# Altium footprint library Molex FFC - FPC Connectors (SMT).PcbLib: 638 footprints (part 35 of 40)
Each footprint in its own frame and in the unit in brackets; x right, y up, seen from the top. Pads: shape width x height; smd on the part's side, far side on the other; paste and mask are expansions set on the pad; w line width, h text height; cw(c..) or ccw(c..) is an arc to the next point about the centre after c.
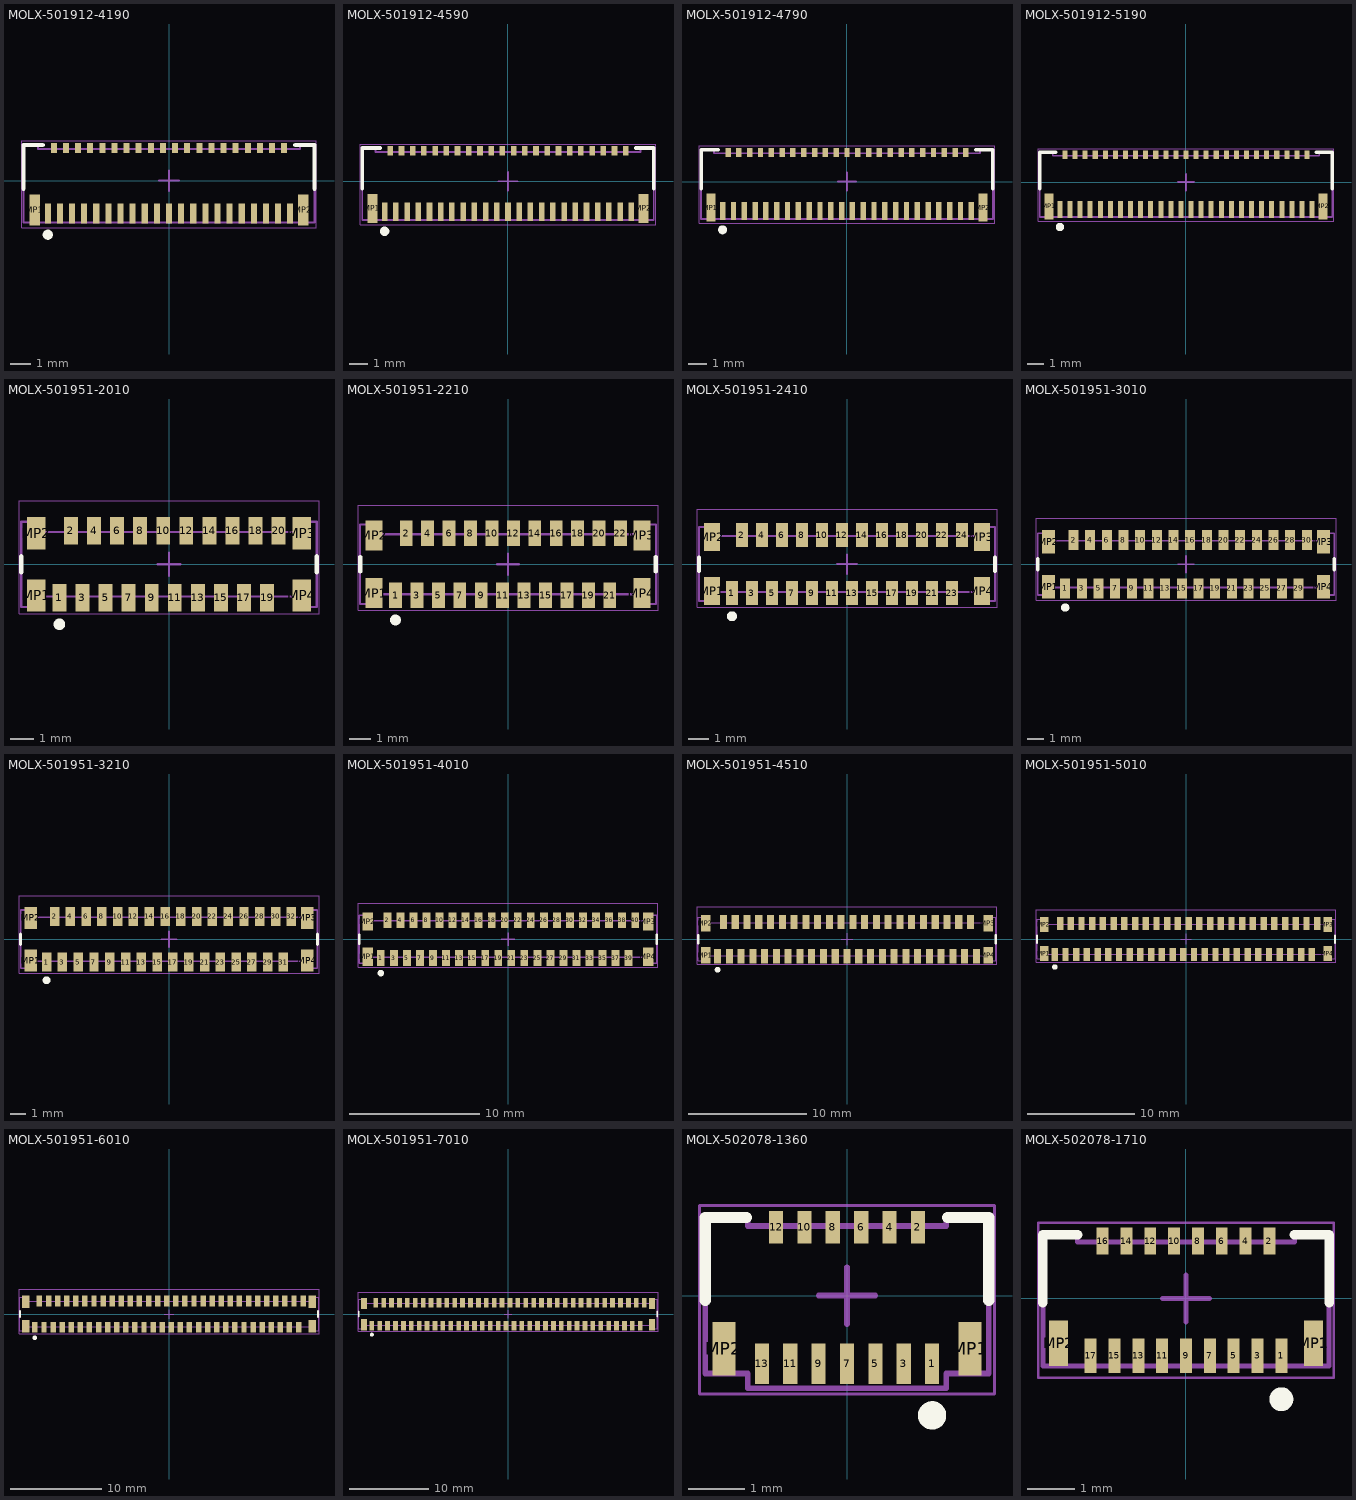
[diagram p34: the footprints below, top view; thin cyan lines are the x and y axes]

## MOLX-501912-4190 [mm] "FPC Connector, 41-Leads, Right Angle, Pitch 0.3 mm, Mated Height 1.8 mm, SMT"
height 1.812
pads (43):
  rect 0.3x1 smd: 1(-6,-1.625) 3(-5.4,-1.625) 5(-4.8,-1.625) 7(-4.2,-1.625) 9(-3.6,-1.625) 11(-3,-1.625) 13(-2.4,-1.625) 15(-1.8,-1.625) 17(-1.2,-1.625) 19(-0.6,-1.625) 21(0,-1.625) 23(0.6,-1.625) 25(1.2,-1.625) 27(1.8,-1.625) 29(2.4,-1.625) 31(3,-1.625) 33(3.6,-1.625) 35(4.2,-1.625) 37(4.8,-1.625) 39(5.4,-1.625) 41(6,-1.625)
  rect 0.3x0.5 smd: 2(-5.7,1.625) 4(-5.1,1.625) 6(-4.5,1.625) 8(-3.9,1.625) 10(-3.3,1.625) 12(-2.7,1.625) 14(-2.1,1.625) 16(-1.5,1.625) 18(-0.9,1.625) 20(-0.3,1.625) 22(0.3,1.625) 24(0.9,1.625) 26(1.5,1.625) 28(2.1,1.625) 30(2.7,1.625) 32(3.3,1.625) 34(3.9,1.625) 36(4.5,1.625) 38(5.1,1.625) 40(5.7,1.625)
  rect 0.52x1.55 smd: MP1(-6.65,-1.45) MP2(6.65,-1.45)
Top Overlay:
  circle w0.25: c-6,-2.675 r0.125
  lines w0.2: -7.2,-0.399 -7.2,1.775 -6.25,1.775 ; 6.25,1.775 7.2,1.775 7.2,-0.399
Mechanical 13:
  lines w0.1: -7.2,-2.075 7.2,-2.075 7.2,1.775 6.48,1.775 6.48,1.575 -6.48,1.575 -6.48,1.775 -7.2,1.775 -7.2,-2.075
Mechanical 15:
  lines w0.05: -7.3,-2.325 7.3,-2.325 7.3,1.975 -7.3,1.975 -7.3,-2.325
  lines w0.1: -0.5,0 0.5,0 ; 0,-0.5 0,0.5
3D body: height 0.25, standoff 0, extent -7.2,-2.075 7.2,1.775

## MOLX-501912-4590 [mm] "FPC Connector, 45-Leads, Right Angle, Pitch 0.3 mm, Mated Height 1.8 mm, SMT"
height 1.812
pads (47):
  rect 0.3x1 smd: 1(-6.6,-1.625) 3(-6,-1.625) 5(-5.4,-1.625) 7(-4.8,-1.625) 9(-4.2,-1.625) 11(-3.6,-1.625) 13(-3,-1.625) 15(-2.4,-1.625) 17(-1.8,-1.625) 19(-1.2,-1.625) 21(-0.6,-1.625) 23(0,-1.625) 25(0.6,-1.625) 27(1.2,-1.625) 29(1.8,-1.625) 31(2.4,-1.625) 33(3,-1.625) 35(3.6,-1.625) 37(4.2,-1.625) 39(4.8,-1.625) 41(5.4,-1.625) 43(6,-1.625) 45(6.6,-1.625)
  rect 0.3x0.5 smd: 2(-6.3,1.625) 4(-5.7,1.625) 6(-5.1,1.625) 8(-4.5,1.625) 10(-3.9,1.625) 12(-3.3,1.625) 14(-2.7,1.625) 16(-2.1,1.625) 18(-1.5,1.625) 20(-0.9,1.625) 22(-0.3,1.625) 24(0.3,1.625) 26(0.9,1.625) 28(1.5,1.625) 30(2.1,1.625) 32(2.7,1.625) 34(3.3,1.625) 36(3.9,1.625) 38(4.5,1.625) 40(5.1,1.625) 42(5.7,1.625) 44(6.3,1.625)
  rect 0.52x1.55 smd: MP1(-7.25,-1.45) MP2(7.25,-1.45)
Top Overlay:
  circle w0.25: c-6.6,-2.675 r0.125
  lines w0.2: -7.8,-0.399 -7.8,1.775 -6.85,1.775 ; 6.85,1.775 7.8,1.775 7.8,-0.399
Mechanical 13:
  lines w0.1: -7.8,-2.075 7.8,-2.075 7.8,1.775 7.08,1.775 7.08,1.575 -7.08,1.575 -7.08,1.775 -7.8,1.775 -7.8,-2.075
Mechanical 15:
  lines w0.05: -7.9,-2.325 -7.9,1.975 7.9,1.975 7.9,-2.325 -7.9,-2.325
  lines w0.1: -0.5,0 0.5,0 ; 0,-0.5 0,0.5
3D body: height 0.25, standoff 0, extent -7.8,-2.075 7.8,1.775

## MOLX-501912-4790 [mm] "FPC Connector, 47-Leads, Right Angle, Pitch 0.3 mm, Mated Height 1.8 mm, SMT"
height 1.812
pads (49):
  rect 0.3x1 smd: 1(-6.9,-1.625) 3(-6.3,-1.625) 5(-5.7,-1.625) 7(-5.1,-1.625) 9(-4.5,-1.625) 11(-3.9,-1.625) 13(-3.3,-1.625) 15(-2.7,-1.625) 17(-2.1,-1.625) 19(-1.5,-1.625) 21(-0.9,-1.625) 23(-0.3,-1.625) 25(0.3,-1.625) 27(0.9,-1.625) 29(1.5,-1.625) 31(2.1,-1.625) 33(2.7,-1.625) 35(3.3,-1.625) 37(3.9,-1.625) 39(4.5,-1.625) 41(5.1,-1.625) 43(5.7,-1.625) 45(6.3,-1.625) 47(6.9,-1.625)
  rect 0.3x0.5 smd: 2(-6.6,1.625) 4(-6,1.625) 6(-5.4,1.625) 8(-4.8,1.625) 10(-4.2,1.625) 12(-3.6,1.625) 14(-3,1.625) 16(-2.4,1.625) 18(-1.8,1.625) 20(-1.2,1.625) 22(-0.6,1.625) 24(0,1.625) 26(0.6,1.625) 28(1.2,1.625) 30(1.8,1.625) 32(2.4,1.625) 34(3,1.625) 36(3.6,1.625) 38(4.2,1.625) 40(4.8,1.625) 42(5.4,1.625) 44(6,1.625) 46(6.6,1.625)
  rect 0.52x1.55 smd: MP1(-7.55,-1.45) MP2(7.55,-1.45)
Top Overlay:
  circle w0.25: c-6.9,-2.675 r0.125
  lines w0.2: -8.1,-0.399 -8.1,1.775 -7.15,1.775 ; 7.15,1.775 8.1,1.775 8.1,-0.399
Mechanical 13:
  lines w0.1: -8.1,-2.075 -8.1,1.775 -7.38,1.775 -7.38,1.575 7.38,1.575 7.38,1.775 8.1,1.775 8.1,-2.075 -8.1,-2.075
Mechanical 15:
  lines w0.05: -8.2,-2.325 8.2,-2.325 8.2,1.975 -8.2,1.975 -8.2,-2.325
  lines w0.1: -0.5,0 0.5,0 ; 0,-0.5 0,0.5
3D body: height 0.25, standoff 0, extent -8.1,-2.075 8.1,1.775

## MOLX-501912-5190 [mm] "FPC Connector, 51-Leads, Right Angle, Pitch 0.3 mm, Mated Height 1.8 mm, SMT"
height 1.812
pads (53):
  rect 0.3x1 smd: 1(-7.5,-1.625) 3(-6.9,-1.625) 5(-6.3,-1.625) 7(-5.7,-1.625) 9(-5.1,-1.625) 11(-4.5,-1.625) 13(-3.9,-1.625) 15(-3.3,-1.625) 17(-2.7,-1.625) 19(-2.1,-1.625) 21(-1.5,-1.625) 23(-0.9,-1.625) 25(-0.3,-1.625) 27(0.3,-1.625) 29(0.9,-1.625) 31(1.5,-1.625) 33(2.1,-1.625) 35(2.7,-1.625) 37(3.3,-1.625) 39(3.9,-1.625) 41(4.5,-1.625) 43(5.1,-1.625) 45(5.7,-1.625) 47(6.3,-1.625) 49(6.9,-1.625) 51(7.5,-1.625)
  rect 0.3x0.5 smd: 2(-7.2,1.625) 4(-6.6,1.625) 6(-6,1.625) 8(-5.4,1.625) 10(-4.8,1.625) 12(-4.2,1.625) 14(-3.6,1.625) 16(-3,1.625) 18(-2.4,1.625) 20(-1.8,1.625) 22(-1.2,1.625) 24(-0.6,1.625) 26(0,1.625) 28(0.6,1.625) 30(1.2,1.625) 32(1.8,1.625) 34(2.4,1.625) 36(3,1.625) 38(3.6,1.625) 40(4.2,1.625) 42(4.8,1.625) 44(5.4,1.625) 46(6,1.625) 48(6.6,1.625) 50(7.2,1.625)
  rect 0.52x1.55 smd: MP1(-8.15,-1.45) MP2(8.15,-1.45)
Top Overlay:
  circle w0.25: c-7.5,-2.675 r0.125
  lines w0.2: -8.7,-0.4 -8.7,1.775 -7.75,1.775 ; 7.75,1.775 8.7,1.775 8.7,-0.4
Mechanical 13:
  lines w0.1: -8.7,-2.075 -8.7,1.775 -7.92,1.775 -7.92,1.575 7.92,1.575 7.92,1.775 8.7,1.775 8.7,-2.075 -8.7,-2.075
Mechanical 15:
  lines w0.05: -8.8,-2.325 8.8,-2.325 8.8,1.975 -8.8,1.975 -8.8,-2.325
  lines w0.1: -0.5,0 0.5,0 ; 0,-0.5 0,0.5
3D body: height 0.25, standoff 0, extent -8.7,-2.075 8.7,1.775

## MOLX-501951-2010 [mm] "FPC Connector, 20-Leads, Vertical, Pitch 0.5 mm, Mated Height 4.05 mm, SMT"
height 4.05
pads (24):
  rect 0.6x1.2 smd: 1(-4.75,-1.45) 2(-4.25,1.45) 3(-3.75,-1.45) 4(-3.25,1.45) 5(-2.75,-1.45) 6(-2.25,1.45) 7(-1.75,-1.45) 8(-1.25,1.45) 9(-0.75,-1.45) 10(-0.25,1.45) 11(0.25,-1.45) 12(0.75,1.45) 13(1.25,-1.45) 14(1.75,1.45) 15(2.25,-1.45) 16(2.75,1.45) 17(3.25,-1.45) 18(3.75,1.45) 19(4.25,-1.45) 20(4.75,1.45)
  rect 0.8x1.4 smd: MP1(-5.75,-1.35) MP2(-5.75,1.35) MP3(5.75,1.35) MP4(5.75,-1.35)
Top Overlay:
  circle w0.25: c-4.75,-2.6 r0.125
  lines w0.2: -6.4,-0.338 -6.4,0.338 ; 6.4,-0.338 6.4,0.338
Mechanical 13:
  lines w0.1: -6.4,-1.85 -5.85,-1.85 -5.85,-1.75 -5.5,-1.75 -5.5,-1.4 5.5,-1.4 5.5,-1.75 5.85,-1.75 5.85,-1.85 6.4,-1.85 6.4,1.85 5.85,1.85 5.85,1.75 5.5,1.75 5.5,1.4 -5.5,1.4 -5.5,1.75 -5.85,1.75 -5.85,1.85 -6.4,1.85 -6.4,-1.85
Mechanical 15:
  lines w0.05: -6.5,-2.15 6.5,-2.15 6.5,2.75 -6.5,2.75 -6.5,-2.15
  lines w0.1: -0.5,0 0.5,0 ; 0,-0.5 0,0.5
3D body: height 0.25, standoff 0, extent -6.4,-1.85 6.4,2.65

## MOLX-501951-2210 [mm] "FPC Connector, 22-Leads, Vertical, Pitch 0.5 mm, Mated Height 4.05 mm, SMT"
height 4.05
pads (26):
  rect 0.6x1.2 smd: 1(-5.25,-1.45) 2(-4.75,1.45) 3(-4.25,-1.45) 4(-3.75,1.45) 5(-3.25,-1.45) 6(-2.75,1.45) 7(-2.25,-1.45) 8(-1.75,1.45) 9(-1.25,-1.45) 10(-0.75,1.45) 11(-0.25,-1.45) 12(0.25,1.45) 13(0.75,-1.45) 14(1.25,1.45) 15(1.75,-1.45) 16(2.25,1.45) 17(2.75,-1.45) 18(3.25,1.45) 19(3.75,-1.45) 20(4.25,1.45) 21(4.75,-1.45) 22(5.25,1.45)
  rect 0.8x1.4 smd: MP1(-6.25,-1.35) MP2(-6.25,1.35) MP3(6.25,1.35) MP4(6.25,-1.35)
Top Overlay:
  circle w0.25: c-5.25,-2.6 r0.125
  lines w0.2: -6.9,-0.338 -6.9,0.338 ; 6.9,-0.338 6.9,0.338
Mechanical 13:
  lines w0.1: -6.9,-1.85 -6.35,-1.85 -6.35,-1.75 -6,-1.75 -6,-1.4 6,-1.4 6,-1.75 6.35,-1.75 6.35,-1.85 6.9,-1.85 6.9,1.85 6.35,1.85 6.35,1.75 6,1.75 6,1.4 -6,1.4 -6,1.75 -6.35,1.75 -6.35,1.85 -6.9,1.85 -6.9,-1.85
Mechanical 15:
  lines w0.05: -7,-2.15 7,-2.15 7,2.75 -7,2.75 -7,-2.15
  lines w0.1: -0.5,0 0.5,0 ; 0,-0.5 0,0.5
3D body: height 0.25, standoff 0, extent -6.9,-1.85 6.9,2.65

## MOLX-501951-2410 [mm] "FPC Connector, 24-Leads, Vertical, Pitch 0.5 mm, Mated Height 4.05 mm, SMT"
height 4.05
pads (28):
  rect 0.6x1.2 smd: 1(-5.75,-1.45) 2(-5.25,1.45) 3(-4.75,-1.45) 4(-4.25,1.45) 5(-3.75,-1.45) 6(-3.25,1.45) 7(-2.75,-1.45) 8(-2.25,1.45) 9(-1.75,-1.45) 10(-1.25,1.45) 11(-0.75,-1.45) 12(-0.25,1.45) 13(0.25,-1.45) 14(0.75,1.45) 15(1.25,-1.45) 16(1.75,1.45) 17(2.25,-1.45) 18(2.75,1.45) 19(3.25,-1.45) 20(3.75,1.45) 21(4.25,-1.45) 22(4.75,1.45) 23(5.25,-1.45) 24(5.75,1.45)
  rect 0.8x1.4 smd: MP1(-6.75,-1.35) MP2(-6.75,1.35) MP3(6.75,1.35) MP4(6.75,-1.35)
Top Overlay:
  circle w0.25: c-5.75,-2.6 r0.125
  lines w0.2: -7.4,-0.338 -7.4,0.338 ; 7.4,-0.338 7.4,0.338
Mechanical 13:
  lines w0.1: -7.4,-1.85 -6.85,-1.85 -6.85,-1.75 -6.5,-1.75 -6.5,-1.4 6.5,-1.4 6.5,-1.75 6.85,-1.75 6.85,-1.85 7.4,-1.85 7.4,1.85 6.85,1.85 6.85,1.75 6.5,1.75 6.5,1.4 -6.5,1.4 -6.5,1.75 -6.85,1.75 -6.85,1.85 -7.4,1.85 -7.4,-1.85
Mechanical 15:
  lines w0.05: -7.5,-2.15 7.5,-2.15 7.5,2.75 -7.5,2.75 -7.5,-2.15
  lines w0.1: -0.5,0 0.5,0 ; 0,-0.5 0,0.5
3D body: height 0.25, standoff 0, extent -7.4,-1.85 7.4,2.65

## MOLX-501951-3010 [mm] "FPC Connector, 30-Leads, Vertical, Pitch 0.5 mm, Mated Height 4.05 mm, SMT"
height 4.05
pads (34):
  rect 0.6x1.2 smd: 1(-7.25,-1.45) 2(-6.75,1.45) 3(-6.25,-1.45) 4(-5.75,1.45) 5(-5.25,-1.45) 6(-4.75,1.45) 7(-4.25,-1.45) 8(-3.75,1.45) 9(-3.25,-1.45) 10(-2.75,1.45) 11(-2.25,-1.45) 12(-1.75,1.45) 13(-1.25,-1.45) 14(-0.75,1.45) 15(-0.25,-1.45) 16(0.25,1.45) 17(0.75,-1.45) 18(1.25,1.45) 19(1.75,-1.45) 20(2.25,1.45) 21(2.75,-1.45) 22(3.25,1.45) 23(3.75,-1.45) 24(4.25,1.45) 25(4.75,-1.45) 26(5.25,1.45) 27(5.75,-1.45) 28(6.25,1.45) 29(6.75,-1.45) 30(7.25,1.45)
  rect 0.8x1.4 smd: MP1(-8.25,-1.35) MP2(-8.25,1.35) MP3(8.25,1.35) MP4(8.25,-1.35)
Top Overlay:
  circle w0.25: c-7.25,-2.6 r0.125
  lines w0.2: -8.9,-0.338 -8.9,0.338 ; 8.9,-0.338 8.9,0.338
Mechanical 13:
  lines w0.1: -8.9,-1.85 -8.35,-1.85 -8.35,-1.75 -8,-1.75 -8,-1.4 8,-1.4 8,-1.75 8.35,-1.75 8.35,-1.85 8.9,-1.85 8.9,1.85 8.35,1.85 8.35,1.75 8,1.75 8,1.4 -8,1.4 -8,1.75 -8.35,1.75 -8.35,1.85 -8.9,1.85 -8.9,-1.85
Mechanical 15:
  lines w0.05: -9,-2.15 9,-2.15 9,2.75 -9,2.75 -9,-2.15
  lines w0.1: -0.5,0 0.5,0 ; 0,-0.5 0,0.5
3D body: height 0.25, standoff 0, extent -8.9,-1.85 8.9,2.65

## MOLX-501951-3210 [mm] "FPC Connector, 32-Leads, Vertical, Pitch 0.5 mm, Mated Height 4.05 mm, SMT"
height 4.05
pads (36):
  rect 0.6x1.2 smd: 1(-7.75,-1.45) 2(-7.25,1.45) 3(-6.75,-1.45) 4(-6.25,1.45) 5(-5.75,-1.45) 6(-5.25,1.45) 7(-4.75,-1.45) 8(-4.25,1.45) 9(-3.75,-1.45) 10(-3.25,1.45) 11(-2.75,-1.45) 12(-2.25,1.45) 13(-1.75,-1.45) 14(-1.25,1.45) 15(-0.75,-1.45) 16(-0.25,1.45) 17(0.25,-1.45) 18(0.75,1.45) 19(1.25,-1.45) 20(1.75,1.45) 21(2.25,-1.45) 22(2.75,1.45) 23(3.25,-1.45) 24(3.75,1.45) 25(4.25,-1.45) 26(4.75,1.45) 27(5.25,-1.45) 28(5.75,1.45) 29(6.25,-1.45) 30(6.75,1.45) 31(7.25,-1.45) 32(7.75,1.45)
  rect 0.8x1.4 smd: MP1(-8.75,-1.35) MP2(-8.75,1.35) MP3(8.75,1.35) MP4(8.75,-1.35)
Top Overlay:
  circle w0.25: c-7.75,-2.6 r0.125
  lines w0.2: -9.4,-0.338 -9.4,0.338 ; 9.4,-0.338 9.4,0.338
Mechanical 13:
  lines w0.1: -9.4,-1.85 -8.85,-1.85 -8.85,-1.75 -8.5,-1.75 -8.5,-1.4 8.5,-1.4 8.5,-1.75 8.85,-1.75 8.85,-1.85 9.4,-1.85 9.4,1.85 8.85,1.85 8.85,1.75 8.5,1.75 8.5,1.4 -8.5,1.4 -8.5,1.75 -8.85,1.75 -8.85,1.85 -9.4,1.85 -9.4,-1.85
Mechanical 15:
  lines w0.05: -9.5,-2.15 9.5,-2.15 9.5,2.75 -9.5,2.75 -9.5,-2.15
  lines w0.1: -0.5,0 0.5,0 ; 0,-0.5 0,0.5
3D body: height 0.25, standoff 0, extent -9.4,-1.85 9.4,2.65

## MOLX-501951-4010 [mm] "FPC Connector, 40-Leads, Vertical, Pitch 0.5 mm, Mated Height 4.05 mm, SMT"
height 4.05
pads (44):
  rect 0.6x1.2 smd: 1(-9.75,-1.45) 2(-9.25,1.45) 3(-8.75,-1.45) 4(-8.25,1.45) 5(-7.75,-1.45) 6(-7.25,1.45) 7(-6.75,-1.45) 8(-6.25,1.45) 9(-5.75,-1.45) 10(-5.25,1.45) 11(-4.75,-1.45) 12(-4.25,1.45) 13(-3.75,-1.45) 14(-3.25,1.45) 15(-2.75,-1.45) 16(-2.25,1.45) 17(-1.75,-1.45) 18(-1.25,1.45) 19(-0.75,-1.45) 20(-0.25,1.45) 21(0.25,-1.45) 22(0.75,1.45) 23(1.25,-1.45) 24(1.75,1.45) 25(2.25,-1.45) 26(2.75,1.45) 27(3.25,-1.45) 28(3.75,1.45) 29(4.25,-1.45) 30(4.75,1.45) 31(5.25,-1.45) 32(5.75,1.45) 33(6.25,-1.45) 34(6.75,1.45) 35(7.25,-1.45) 36(7.75,1.45) 37(8.25,-1.45) 38(8.75,1.45) 39(9.25,-1.45) 40(9.75,1.45)
  rect 0.8x1.4 smd: MP1(-10.75,-1.35) MP2(-10.75,1.35) MP3(10.75,1.35) MP4(10.75,-1.35)
Top Overlay:
  circle w0.25: c-9.75,-2.6 r0.125
  lines w0.2: -11.4,-0.338 -11.4,0.338 ; 11.4,-0.338 11.4,0.338
Mechanical 13:
  lines w0.1: 11.4,-1.85 10.85,-1.85 10.85,-1.75 10.5,-1.75 10.5,-1.4 -10.5,-1.4 -10.5,-1.75 -10.85,-1.75 -10.85,-1.85 -11.4,-1.85 -11.4,1.85 -10.85,1.85 -10.85,1.75 -10.5,1.75 -10.5,1.4 10.5,1.4 10.5,1.75 10.85,1.75 10.85,1.85 11.4,1.85 11.4,-1.85
Mechanical 15:
  lines w0.05: -11.5,-2.15 11.5,-2.15 11.5,2.75 -11.5,2.75 -11.5,-2.15
  lines w0.1: -0.5,0 0.5,0 ; 0,-0.5 0,0.5
3D body: height 0.25, standoff 0, extent -11.4,-1.85 11.4,2.65

## MOLX-501951-4510 [mm] "FPC Connector, 45-Leads, Vertical, Pitch 0.5 mm, Mated Height 4.05 mm, SMT"
height 4.05
pads (49):
  rect 0.6x1.2 smd: 1(-11,-1.45) 2(-10.5,1.45) 3(-10,-1.45) 4(-9.5,1.45) 5(-9,-1.45) 6(-8.5,1.45) 7(-8,-1.45) 8(-7.5,1.45) 9(-7,-1.45) 10(-6.5,1.45) 11(-6,-1.45) 12(-5.5,1.45) 13(-5,-1.45) 14(-4.5,1.45) 15(-4,-1.45) 16(-3.5,1.45) 17(-3,-1.45) 18(-2.5,1.45) 19(-2,-1.45) 20(-1.5,1.45) 21(-1,-1.45) 22(-0.5,1.45) 23(0,-1.45) 24(0.5,1.45) 25(1,-1.45) 26(1.5,1.45) 27(2,-1.45) 28(2.5,1.45) 29(3,-1.45) 30(3.5,1.45) 31(4,-1.45) 32(4.5,1.45) 33(5,-1.45) 34(5.5,1.45) 35(6,-1.45) 36(6.5,1.45) 37(7,-1.45) 38(7.5,1.45) 39(8,-1.45) 40(8.5,1.45) 41(9,-1.45) 42(9.5,1.45) 43(10,-1.45) 44(10.5,1.45) 45(11,-1.45)
  rect 0.8x1.4 smd: MP1(-12,-1.35) MP2(-12,1.35) MP3(12,1.35) MP4(12,-1.35)
Top Overlay:
  circle w0.25: c-11,-2.6 r0.125
  lines w0.2: -12.65,-0.338 -12.65,0.338 ; 12.65,-0.338 12.65,0.338
Mechanical 13:
  lines w0.1: -12.65,-1.85 -12.1,-1.85 -12.1,-1.75 -11.75,-1.75 -11.75,-1.4 11.75,-1.4 11.75,-1.75 12.1,-1.75 12.1,-1.85 12.65,-1.85 12.65,1.85 12.1,1.85 12.1,1.75 11.75,1.75 11.75,1.4 -11.75,1.4 -11.75,1.75 -12.1,1.75 -12.1,1.85 -12.65,1.85 -12.65,-1.85
Mechanical 15:
  lines w0.05: -12.75,-2.15 12.75,-2.15 12.75,2.75 -12.75,2.75 -12.75,-2.15
  lines w0.1: -0.5,0 0.5,0 ; 0,-0.5 0,0.5
3D body: height 0.25, standoff 0, extent -12.65,-1.85 12.65,2.65

## MOLX-501951-5010 [mm] "FPC Connector, 50-Leads, Vertical, Pitch 0.5 mm, Mated Height 4.05 mm, SMT"
height 4.05
pads (54):
  rect 0.6x1.2 smd: 1(-12.25,-1.45) 2(-11.75,1.45) 3(-11.25,-1.45) 4(-10.75,1.45) 5(-10.25,-1.45) 6(-9.75,1.45) 7(-9.25,-1.45) 8(-8.75,1.45) 9(-8.25,-1.45) 10(-7.75,1.45) 11(-7.25,-1.45) 12(-6.75,1.45) 13(-6.25,-1.45) 14(-5.75,1.45) 15(-5.25,-1.45) 16(-4.75,1.45) 17(-4.25,-1.45) 18(-3.75,1.45) 19(-3.25,-1.45) 20(-2.75,1.45) 21(-2.25,-1.45) 22(-1.75,1.45) 23(-1.25,-1.45) 24(-0.75,1.45) 25(-0.25,-1.45) 26(0.25,1.45) 27(0.75,-1.45) 28(1.25,1.45) 29(1.75,-1.45) 30(2.25,1.45) 31(2.75,-1.45) 32(3.25,1.45) 33(3.75,-1.45) 34(4.25,1.45) 35(4.75,-1.45) 36(5.25,1.45) 37(5.75,-1.45) 38(6.25,1.45) 39(6.75,-1.45) 40(7.25,1.45) 41(7.75,-1.45) 42(8.25,1.45) 43(8.75,-1.45) 44(9.25,1.45) 45(9.75,-1.45) 46(10.25,1.45) 47(10.75,-1.45) 48(11.25,1.45) 49(11.75,-1.45) 50(12.25,1.45)
  rect 0.8x1.4 smd: MP1(-13.25,-1.35) MP2(-13.25,1.35) MP3(13.25,1.35) MP4(13.25,-1.35)
Top Overlay:
  circle w0.25: c-12.25,-2.6 r0.125
  lines w0.2: -13.9,-0.338 -13.9,0.338 ; 13.9,-0.338 13.9,0.338
Mechanical 13:
  lines w0.1: -13.9,-1.85 -13.35,-1.85 -13.35,-1.75 -13,-1.75 -13,-1.4 13,-1.4 13,-1.75 13.35,-1.75 13.35,-1.85 13.9,-1.85 13.9,1.85 13.35,1.85 13.35,1.75 13,1.75 13,1.4 -13,1.4 -13,1.75 -13.35,1.75 -13.35,1.85 -13.9,1.85 -13.9,-1.85
Mechanical 15:
  lines w0.05: -14,-2.15 14,-2.15 14,2.75 -14,2.75 -14,-2.15
  lines w0.1: -0.5,0 0.5,0 ; 0,-0.5 0,0.5
3D body: height 0.25, standoff 0, extent -13.9,-1.85 13.9,2.65

## MOLX-501951-6010 [mm] "FPC Connector, 60-Leads, Vertical, Pitch 0.5 mm, Mated Height 4.05 mm, SMT"
height 4.05
pads (64):
  rect 0.6x1.2 smd: 1(-14.75,-1.45) 2(-14.25,1.45) 3(-13.75,-1.45) 4(-13.25,1.45) 5(-12.75,-1.45) 6(-12.25,1.45) 7(-11.75,-1.45) 8(-11.25,1.45) 9(-10.75,-1.45) 10(-10.25,1.45) 11(-9.75,-1.45) 12(-9.25,1.45) 13(-8.75,-1.45) 14(-8.25,1.45) 15(-7.75,-1.45) 16(-7.25,1.45) 17(-6.75,-1.45) 18(-6.25,1.45) 19(-5.75,-1.45) 20(-5.25,1.45) 21(-4.75,-1.45) 22(-4.25,1.45) 23(-3.75,-1.45) 24(-3.25,1.45) 25(-2.75,-1.45) 26(-2.25,1.45) 27(-1.75,-1.45) 28(-1.25,1.45) 29(-0.75,-1.45) 30(-0.25,1.45) 31(0.25,-1.45) 32(0.75,1.45) 33(1.25,-1.45) 34(1.75,1.45) 35(2.25,-1.45) 36(2.75,1.45) 37(3.25,-1.45) 38(3.75,1.45) 39(4.25,-1.45) 40(4.75,1.45) 41(5.25,-1.45) 42(5.75,1.45) 43(6.25,-1.45) 44(6.75,1.45) 45(7.25,-1.45) 46(7.75,1.45) 47(8.25,-1.45) 48(8.75,1.45) 49(9.25,-1.45) 50(9.75,1.45) 51(10.25,-1.45) 52(10.75,1.45) 53(11.25,-1.45) 54(11.75,1.45) 55(12.25,-1.45) 56(12.75,1.45) 57(13.25,-1.45) 58(13.75,1.45) 59(14.25,-1.45) 60(14.75,1.45)
  rect 0.8x1.4 smd: MP1(-15.75,-1.35) MP2(-15.75,1.35) MP3(15.75,1.35) MP4(15.75,-1.35)
Top Overlay:
  circle w0.25: c-14.75,-2.6 r0.125
  lines w0.2: -16.4,-0.338 -16.4,0.338 ; 16.4,-0.338 16.4,0.338
Mechanical 13:
  lines w0.1: 16.4,-1.85 15.85,-1.85 15.85,-1.75 15.5,-1.75 15.5,-1.4 -15.5,-1.4 -15.5,-1.75 -15.85,-1.75 -15.85,-1.85 -16.4,-1.85 -16.4,1.85 -15.85,1.85 -15.85,1.75 -15.5,1.75 -15.5,1.4 15.5,1.4 15.5,1.75 15.85,1.75 15.85,1.85 16.4,1.85 16.4,-1.85
Mechanical 15:
  lines w0.05: -16.5,-2.15 16.5,-2.15 16.5,2.75 -16.5,2.75 -16.5,-2.15
  lines w0.1: -0.5,0 0.5,0 ; 0,-0.5 0,0.5
3D body: height 0.25, standoff 0, extent -16.4,-1.85 16.4,2.65

## MOLX-501951-7010 [mm] "FPC Connector, 70-Leads, Vertical, Pitch 0.5 mm, Mated Height 4.05 mm, SMT"
height 4.05
pads (74):
  rect 0.6x1.2 smd: 1(-17.25,-1.45) 2(-16.75,1.45) 3(-16.25,-1.45) 4(-15.75,1.45) 5(-15.25,-1.45) 6(-14.75,1.45) 7(-14.25,-1.45) 8(-13.75,1.45) 9(-13.25,-1.45) 10(-12.75,1.45) 11(-12.25,-1.45) 12(-11.75,1.45) 13(-11.25,-1.45) 14(-10.75,1.45) 15(-10.25,-1.45) 16(-9.75,1.45) 17(-9.25,-1.45) 18(-8.75,1.45) 19(-8.25,-1.45) 20(-7.75,1.45) 21(-7.25,-1.45) 22(-6.75,1.45) 23(-6.25,-1.45) 24(-5.75,1.45) 25(-5.25,-1.45) 26(-4.75,1.45) 27(-4.25,-1.45) 28(-3.75,1.45) 29(-3.25,-1.45) 30(-2.75,1.45) 31(-2.25,-1.45) 32(-1.75,1.45) 33(-1.25,-1.45) 34(-0.75,1.45) 35(-0.25,-1.45) 36(0.25,1.45) 37(0.75,-1.45) 38(1.25,1.45) 39(1.75,-1.45) 40(2.25,1.45) 41(2.75,-1.45) 42(3.25,1.45) 43(3.75,-1.45) 44(4.25,1.45) 45(4.75,-1.45) 46(5.25,1.45) 47(5.75,-1.45) 48(6.25,1.45) 49(6.75,-1.45) 50(7.25,1.45) 51(7.75,-1.45) 52(8.25,1.45) 53(8.75,-1.45) 54(9.25,1.45) 55(9.75,-1.45) 56(10.25,1.45) 57(10.75,-1.45) 58(11.25,1.45) 59(11.75,-1.45) 60(12.25,1.45) 61(12.75,-1.45) 62(13.25,1.45) 63(13.75,-1.45) 64(14.25,1.45) 65(14.75,-1.45) 66(15.25,1.45) 67(15.75,-1.45) 68(16.25,1.45) 69(16.75,-1.45) 70(17.25,1.45)
  rect 0.8x1.4 smd: MP1(-18.25,-1.35) MP2(-18.25,1.35) MP3(18.25,1.35) MP4(18.25,-1.35)
Top Overlay:
  circle w0.25: c-17.25,-2.6 r0.125
  lines w0.2: -18.9,-0.338 -18.9,0.338 ; 18.9,-0.338 18.9,0.338
Mechanical 13:
  lines w0.1: -18.9,-1.85 -18.35,-1.85 -18.35,-1.75 -18,-1.75 -18,-1.4 18,-1.4 18,-1.75 18.35,-1.75 18.35,-1.85 18.9,-1.85 18.9,1.85 18.35,1.85 18.35,1.75 18,1.75 18,1.4 -18,1.4 -18,1.75 -18.35,1.75 -18.35,1.85 -18.9,1.85 -18.9,-1.85
Mechanical 15:
  lines w0.05: -19,-2.15 19,-2.15 19,2.75 -19,2.75 -19,-2.15
  lines w0.1: -0.5,0 0.5,0 ; 0,-0.5 0,0.5
3D body: height 0.25, standoff 0, extent -18.9,-1.85 18.9,2.65

## MOLX-502078-1360 [mm] "FPC Connector, 13-Leads, Right Angle, Pitch 0.25 mm, Mated Height 1.0 mm, SMT"
height 1.012
pads (15):
  rect 0.25x0.72 smd paste-0.06: 1(1.5,-1.202) 3(1,-1.202) 5(0.5,-1.202) 7(0,-1.202) 9(-0.5,-1.202) 11(-1,-1.202) 13(-1.5,-1.202)
  rect 0.25x0.57 smd paste-0.06: 2(1.25,1.203) 4(0.75,1.203) 6(0.25,1.203) 8(-0.25,1.203) 10(-0.75,1.203) 12(-1.25,1.203)
  rect 0.4x0.95 smd paste-0.06: MP1(2.17,-0.937) MP2(-2.17,-0.937)
Top Overlay:
  circle w0.25: c1.5,-2.113 r0.125
  lines w0.2: -2.5,-0.084 -2.5,1.375 -2.5,1.375 ; -1.775,1.375 -2.5,1.375 ; 1.775,1.375 2.5,1.375 2.5,-0.084 ; -2.5,1.375 -2.5,1.375
Mechanical 13:
  lines w0.1: -2.5,-1.375 -1.75,-1.375 -1.75,-1.636 1.75,-1.636 1.75,-1.375 2.5,-1.375 2.5,1.375 1.75,1.375 1.75,1.225 -1.75,1.225 -1.75,1.375 -2.5,1.375 -2.5,-1.375
Mechanical 15:
  lines w0.05: -2.6,-1.736 2.6,-1.736 2.6,1.587 -2.6,1.587 -2.6,-1.736
  lines w0.1: -0.5,0 0.5,0 ; 0,-0.5 0,0.5
3D body: height 0.25, standoff 0, extent -2.5,-1.636 2.5,1.375

## MOLX-502078-1710 [mm] "FPC Connector, 17-Leads, Right Angle, Pitch 0.25 mm, Mated Height 1.0 mm, SMT"
height 1.012
pads (19):
  rect 0.25x0.72 smd: 1(2,-1.202) 3(1.5,-1.202) 5(1,-1.202) 7(0.5,-1.202) 9(0,-1.202) 11(-0.5,-1.202) 13(-1,-1.202) 15(-1.5,-1.202) 17(-2,-1.202)
  rect 0.25x0.57 smd: 2(1.75,1.202) 4(1.25,1.202) 6(0.75,1.202) 8(0.25,1.202) 10(-0.25,1.202) 12(-0.75,1.202) 14(-1.25,1.202) 16(-1.75,1.202)
  rect 0.4x0.95 smd: MP1(2.67,-0.937) MP2(-2.67,-0.937)
Top Overlay:
  circle w0.25: c2,-2.112 r0.125
  lines w0.2: -3,-0.085 -3,1.337 -2.275,1.337 ; 2.275,1.337 3,1.337 3,-0.085
Mechanical 13:
  lines w0.1: -3,-1.412 3,-1.412 3,1.338 2.275,1.337 2.275,1.187 -2.275,1.187 -2.275,1.337 -3,1.337 -3,-1.413
Mechanical 15:
  lines w0.05: -3.1,-1.662 3.1,-1.662 3.1,1.587 -3.1,1.587 -3.1,-1.662
  lines w0.1: -0.5,0 0.5,0 ; 0,-0.5 0,0.5
3D body: height 0.25, standoff 0, extent -3,-1.412 3,1.338